# Altium footprint library 2.54-华普微电子模块.PcbLib: 59 footprints (part 2 of 4)
Each footprint in its own frame and in the unit in brackets; x right, y up, seen from the top. Pads: shape width x height; smd on the part's side, far side on the other; paste and mask are expansions set on the pad; w line width, h text height; cw(c..) or ccw(c..) is an arc to the next point about the centre after c.
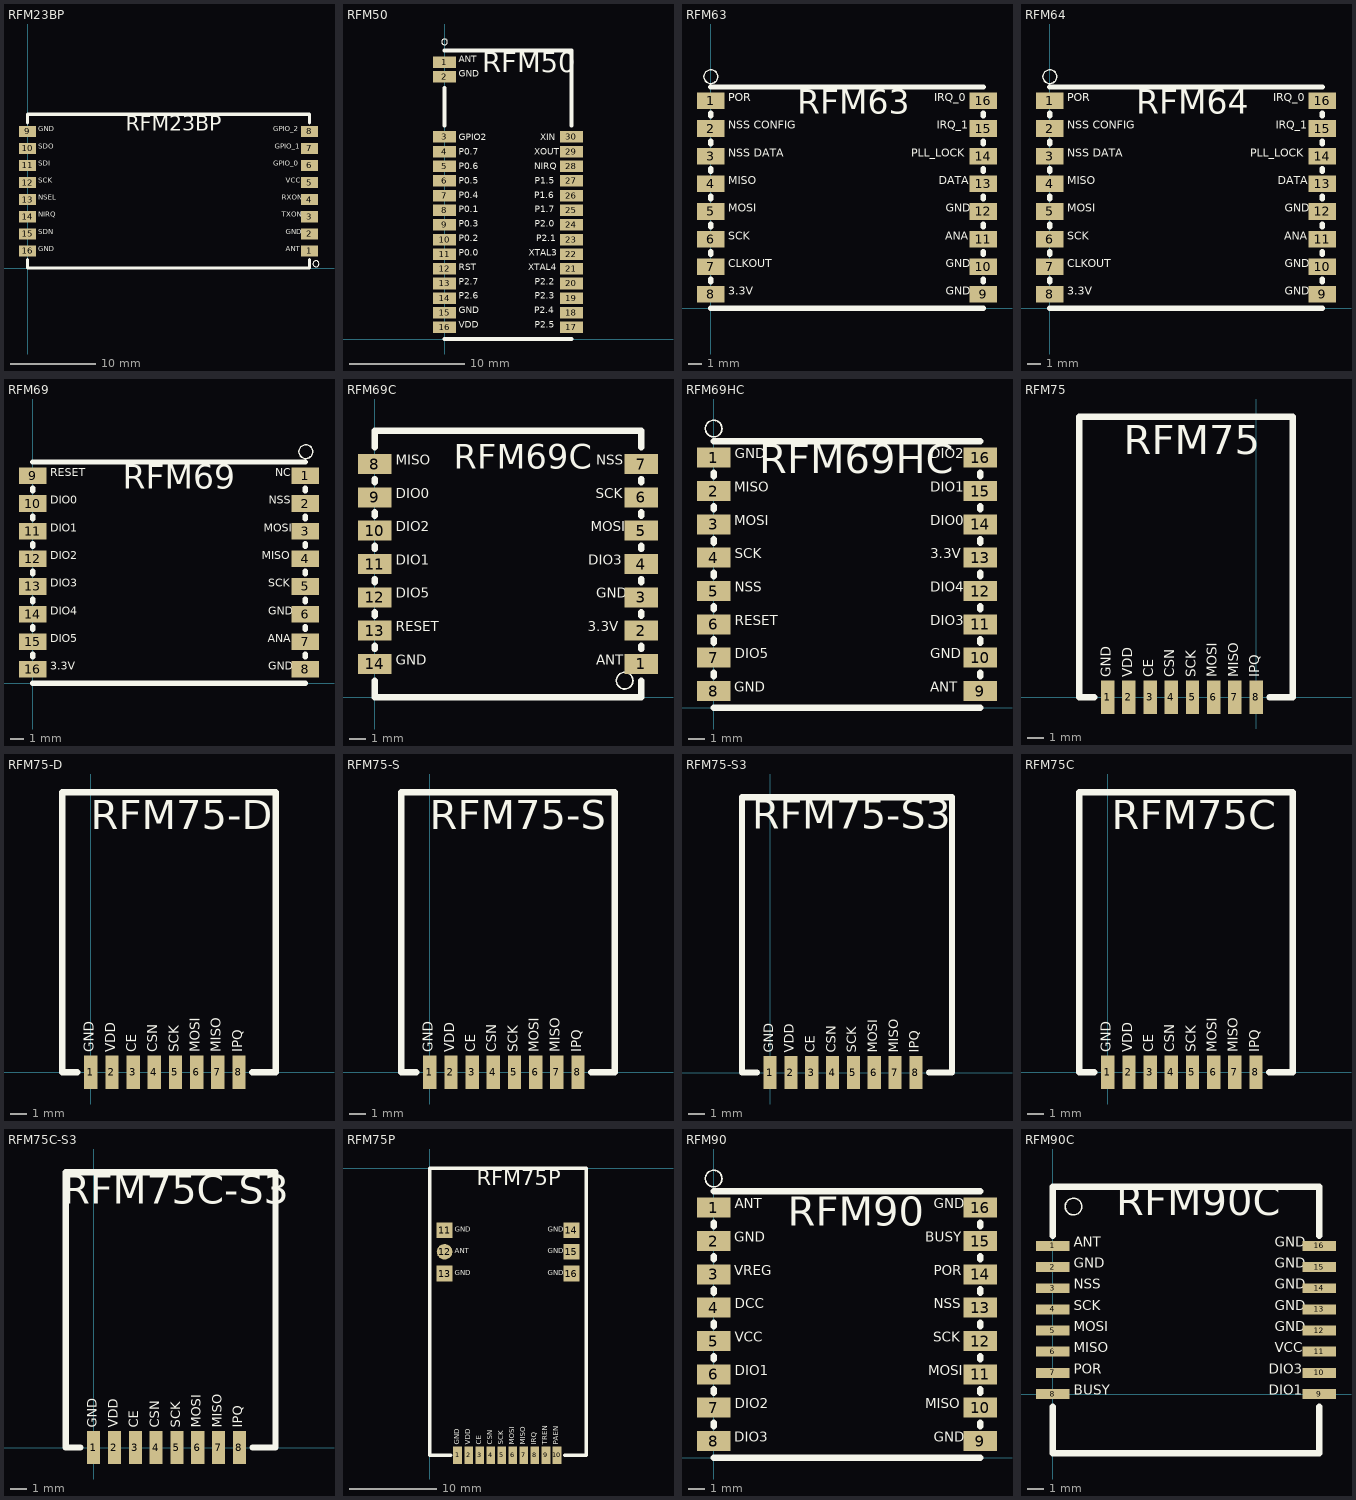
[diagram p1: the footprints below, top view; thin cyan lines are the x and y axes]

## RFM23BP [mm]
pads (16):
  rect 2x1.3 smd: 1(33,2) 2(33,4) 3(33,6) 4(33,8) 5(33,10) 6(33,12) 7(33,14) 8(33,16) 9(0,16) 10(0,14) 11(0,12) 12(0,10) 13(0,8) 14(0,6) 15(0,4) 16(0,2)
Top Overlay:
  circle w0.1: c33.75,0.5 r0.354
  lines w0.381: 0,1 0,0 33,0 33,1 ; 0,17 0,18 33,18 33,17
  text "GND" at 1.25,15.75 h1
  text "SDO" at 1.25,13.75 h1
  text "SDI" at 1.25,11.75 h1
  text "SCK" at 1.25,9.75 h1
  text "NSEL" at 1.25,7.75 h1
  text "NIRQ" at 1.25,5.75 h1
  text "SDN" at 1.25,3.75 h1
  text "GPIO_2" at 28.757,15.75 h1
  text "GPIO_1" at 28.902,13.75 h1
  text "GPIO_0" at 28.75,11.75 h1
  text "VCC" at 30.203,9.75 h1
  text "RXON" at 29.76,7.75 h1
  text "TXON" at 29.76,5.75 h1
  text "GND" at 30.239,3.75 h1
  text "GND" at 1.25,1.75 h1
  text "ANT" at 30.228,1.75 h1
  text "RFM23BP" at 11.5,15.5 h3

## RFM50 [mm]
pads (30):
  rect 2x1 smd: 1(0,24) 3(0,17.51) 4(0,16.24) 5(0,14.97) 6(0,13.7) 7(0,12.43) 8(0,11.16) 9(0,9.89) 10(0,8.62) 11(0,7.35) 12(0,6.08) 13(0,4.81) 14(0,3.54) 15(0,2.27) 16(0,1) 17(11,1) 18(11,2.27) 19(11,3.54) 20(11,4.81) 21(11,6.08) 22(11,7.35) 23(11,8.62) 24(11,9.89) 25(11,11.16) 26(11,12.43) 27(11,13.7) 28(11,14.97) 29(11,16.24) 30(11,17.51)
  rect 2x1 smd paste+0: 2(0,22.73)
Top Overlay:
  circle w0.1: c0,25.75 r0.25
  lines w0.381: 0,0 11,0 ; 0,18.5 0,21.75 ; 0,25 11,25 11,18.5
  text "RFM50" at 3.25,22.5 h3
  text "ANT" at 1.25,23.75 h1
  text "GND" at 1.25,22.5 h1
  text "GPIO2" at 1.25,17 h1
  text "P0.7" at 1.25,15.75 h1
  text "P0.6" at 1.25,14.5 h1
  text "P0.5" at 1.25,13.25 h1
  text "P0.4" at 1.25,12 h1
  text "P0.1" at 1.25,10.75 h1
  text "P0.3" at 1.25,9.5 h1
  text "P0.2" at 1.25,8.25 h1
  text "P0.0" at 1.25,7 h1
  text "RST" at 1.25,5.75 h1
  text "P2.7" at 1.25,4.5 h1
  text "P2.6" at 1.25,3.25 h1
  text "GND" at 1.25,2 h1
  text "VDD" at 1.25,0.75 h1
  text "P2.5" at 7.821,0.75 h1
  text "P2.4" at 7.784,2 h1
  text "P2.3" at 7.823,3.25 h1
  text "P2.2" at 7.823,4.5 h1
  text "XTAL4" at 7.25,5.75 h1
  text "XTAL3" at 7.289,7 h1
  text "P2.1" at 7.967,8.25 h1
  text "P2.0" at 7.816,9.5 h1
  text "P1.7" at 7.804,10.75 h1
  text "P1.6" at 7.79,12 h1
  text "NIRQ" at 7.792,14.505 h1
  text "XOUT" at 7.784,15.755 h1
  text "XIN" at 8.284,16.992 h1
  text "P1.5" at 7.821,13.25 h1

## RFM63 [mm]
pads (16):
  rect 2x1.2 smd: 1(0,15) 2(0,13) 3(0,11) 4(0,9) 5(0,7) 6(0,5) 7(0,3) 8(0,1) 9(19.7,1) 10(19.7,3) 11(19.7,5) 12(19.7,7) 13(19.7,9) 14(19.7,11) 15(19.7,13) 16(19.7,15)
Top Overlay:
  circle w0.1: c0,16.75 r0.5
  lines w0.381: 0,0 19.7,0 ; 0,1.9 0,2.1 ; 0,3.9 0,4.1 ; 0,5.9 0,6.1 ; 0,7.9 0,8.1 ; 0,9.9 0,10.1 ; 0,11.9 0,12.1 ; 0,13.9 0,14.1 ; 0,16 19.7,16 ; 19.7,1.9 19.7,2.1 ; 19.7,3.9 19.7,4.1 ; 19.7,5.9 19.7,6.1 ; 19.7,7.9 19.7,8.1 ; 19.7,9.9 19.7,10.1 ; 19.7,11.9 19.7,12.1 ; 19.7,13.9 19.7,14.1
  text "GND" at 17,0.75 h1
  text "GND" at 17,2.75 h1
  text "ANA" at 16.954,4.75 h1
  text "GND" at 17,6.75 h1
  text "IRQ_0" at 16.173,14.75 h1
  text "IRQ_1" at 16.325,12.75 h1
  text "PLL_LOCK" at 14.5,10.75 h1
  text "DATA" at 16.485,8.75 h1
  text "MOSI" at 1.25,6.75 h1
  text "SCK" at 1.25,4.75 h1
  text "CLKOUT" at 1.25,2.75 h1
  text "3.3V" at 1.249,0.75 h1
  text "MISO" at 1.25,8.75 h1
  text "NSS DATA" at 1.249,10.75 h1
  text "NSS CONFIG" at 1.249,12.75 h1
  text "POR" at 1.25,14.75 h1
  text "RFM63" at 6.25,13.5 h3

## RFM64 [mm]
pads (16):
  rect 2x1.2 smd: 1(0,15) 2(0,13) 3(0,11) 4(0,9) 5(0,7) 6(0,5) 7(0,3) 8(0,1) 9(19.7,1) 10(19.7,3) 11(19.7,5) 12(19.7,7) 13(19.7,9) 14(19.7,11) 15(19.7,13) 16(19.7,15)
Top Overlay:
  circle w0.1: c0,16.75 r0.5
  lines w0.381: 0,0 19.7,0 ; 0,1.9 0,2.1 ; 0,3.9 0,4.1 ; 0,5.9 0,6.1 ; 0,7.9 0,8.1 ; 0,9.9 0,10.1 ; 0,11.9 0,12.1 ; 0,13.9 0,14.1 ; 0,16 19.7,16 ; 19.7,1.9 19.7,2.1 ; 19.7,3.9 19.7,4.1 ; 19.7,5.9 19.7,6.1 ; 19.7,7.9 19.7,8.1 ; 19.7,9.9 19.7,10.1 ; 19.7,11.9 19.7,12.1 ; 19.7,13.9 19.7,14.1
  text "GND" at 17,0.75 h1
  text "GND" at 17,2.75 h1
  text "ANA" at 16.954,4.75 h1
  text "GND" at 17,6.75 h1
  text "IRQ_0" at 16.173,14.75 h1
  text "IRQ_1" at 16.325,12.75 h1
  text "PLL_LOCK" at 14.5,10.75 h1
  text "DATA" at 16.485,8.75 h1
  text "MOSI" at 1.25,6.75 h1
  text "SCK" at 1.25,4.75 h1
  text "CLKOUT" at 1.25,2.75 h1
  text "3.3V" at 1.249,0.75 h1
  text "MISO" at 1.25,8.75 h1
  text "NSS DATA" at 1.249,10.75 h1
  text "NSS CONFIG" at 1.249,12.75 h1
  text "POR" at 1.25,14.75 h1
  text "RFM64" at 6.25,13.5 h3

## RFM69 [mm]
pads (16):
  rect 2x1.2 smd: 1(19.7,15) 2(19.7,13) 3(19.7,11) 4(19.7,9) 5(19.7,7) 6(19.7,5) 7(19.7,3) 8(19.7,1) 9(0,15) 10(0,13) 11(0,11) 12(0,9) 13(0,7) 14(0,5) 15(0,3) 16(0,1)
Top Overlay:
  circle w0.1: c19.75,16.75 r0.5
  lines w0.381: 0,0 19.7,0 ; 0,1.9 0,2.1 ; 0,3.9 0,4.1 ; 0,5.9 0,6.1 ; 0,7.9 0,8.1 ; 0,9.9 0,10.1 ; 0,11.9 0,12.1 ; 0,13.9 0,14.1 ; 0,16 19.7,16 ; 19.7,1.9 19.7,2.1 ; 19.7,3.9 19.7,4.1 ; 19.7,5.9 19.7,6.1 ; 19.7,7.9 19.7,8.1 ; 19.7,9.9 19.7,10.1 ; 19.7,11.9 19.7,12.1 ; 19.7,13.9 19.7,14.1
  text "GND" at 17.046,0.75 h1
  text "ANA" at 17,2.75 h1
  text "GND" at 17.046,4.75 h1
  text "SCK" at 17.027,6.75 h1
  text "NC" at 17.541,14.75 h1
  text "NSS" at 17.054,12.75 h1
  text "MOSI" at 16.714,10.75 h1
  text "MISO" at 16.543,8.75 h1
  text "DIO3" at 1.25,6.75 h1
  text "DIO4" at 1.25,4.75 h1
  text "DIO5" at 1.25,2.75 h1
  text "3.3V" at 1.249,0.75 h1
  text "DIO2" at 1.25,8.75 h1
  text "DIO1" at 1.249,10.75 h1
  text "DIO0" at 1.249,12.75 h1
  text "RESET" at 1.25,14.75 h1
  text "RFM69" at 6.5,13.5 h3

## RFM69C [mm]
pads (14):
  rect 2x1.2 smd: 1(16,2) 2(16,4) 3(16,6) 4(16,8) 5(16,10) 6(16,12) 7(16,14) 8(0,14) 9(0,12) 10(0,10) 11(0,8) 12(0,6) 13(0,4) 14(0,2)
Top Overlay:
  circle w0.1: c15,1 r0.5
  lines w0.381: 0,1 0,0 16,0 16,1 ; 0,2.9 0,3.1 ; 0,4.9 0,5.1 ; 0,6.9 0,7.1 ; 0,8.9 0,9.1 ; 0,10.9 0,11.1 ; 0,12.9 0,13.1 ; 0,15 0,16 16,16 16,15 ; 16,2.9 16,3.1 ; 16,4.9 16,5.1 ; 16,6.9 16,7.1 ; 16,8.9 16,9.1 ; 16,10.9 16,11.1 ; 16,12.9 16,13.1
  text "ANT" at 13.285,1.75 h1
  text "3.3V" at 12.781,3.75 h1
  text "GND" at 13.296,5.75 h1
  text "DIO3" at 12.82,7.75 h1
  text "MOSI" at 12.964,9.75 h1
  text "SCK" at 13.276,11.75 h1
  text "NSS" at 13.303,13.75 h1
  text "GND" at 1.25,1.75 h1
  text "RESET" at 1.25,3.75 h1
  text "DIO5" at 1.25,5.75 h1
  text "DIO1" at 1.25,7.75 h1
  text "DIO2" at 1.25,9.75 h1
  text "DIO0" at 1.25,11.75 h1
  text "MISO" at 1.25,13.75 h1
  text "RFM69C" at 4.75,13.25 h2.5

## RFM69HC [mm]
pads (16):
  rect 2x1.2 smd: 1(0,15) 2(0,13) 3(0,11) 4(0,9) 5(0,7) 6(0,5) 7(0,3) 8(0,1) 9(16,1) 10(16,3) 11(16,5) 12(16,7) 13(16,9) 14(16,11) 15(16,13) 16(16,15)
Top Overlay:
  circle w0.1: c0,16.75 r0.5
  lines w0.381: 0,0 16,0 ; 0,1.9 0,2.1 ; 0,3.9 0,4.1 ; 0,5.9 0,6.1 ; 0,7.9 0,8.1 ; 0,9.9 0,10.1 ; 0,11.9 0,12.1 ; 0,13.9 0,14.1 ; 0,16 16,16 ; 16,1.9 16,2.1 ; 16,3.9 16,4.1 ; 16,5.9 16,6.1 ; 16,7.9 16,8.1 ; 16,9.9 16,10.1 ; 16,11.9 16,12.1 ; 16,13.9 16,14.1
  text "ANT" at 13.001,0.75 h1
  text "GND" at 13.001,2.75 h1
  text "DIO3" at 13,4.75 h1
  text "DIO4" at 13,6.75 h1
  text "DIO2" at 13,14.75 h1
  text "DIO1" at 13,12.75 h1
  text "DIO0" at 13,10.75 h1
  text "3.3V" at 13,8.75 h1
  text "NSS" at 1.25,6.75 h1
  text "RESET" at 1.25,4.75 h1
  text "DIO5" at 1.25,2.75 h1
  text "GND" at 1.249,0.75 h1
  text "SCK" at 1.25,8.75 h1
  text "MOSI" at 1.249,10.75 h1
  text "MISO" at 1.249,12.75 h1
  text "GND" at 1.25,14.75 h1
  text "RFM69HC" at 2.75,13.5 h3

## RFM75 [mm]
pads (8):
  rect 0.8x2 smd: 1(-8.89,0) 2(-7.62,0) 3(-6.35,0) 4(-5.08,0) 5(-3.81,0) 6(-2.54,0) 7(-1.27,0) 8(0,0)
Top Overlay:
  lines w0.381: -9.7,0 -10.6,0 -10.6,16.8 2.2,16.8 2.2,0 0.8,0
  text "RFM75" at -7.915,13.97 h3
  text "IPQ" at 0.4,1.2 h1
  text "MISO" at -0.87,1.2 h1
  text "MOSI" at -2.14,1.2 h1
  text "SCK" at -3.41,1.2 h1
  text "CSN" at -4.68,1.2 h1
  text "CE" at -5.95,1.2 h1
  text "VDD" at -7.22,1.2 h1
  text "GND" at -8.49,1.2 h1

## RFM75-D [mm]
pads (8):
  rect 0.8x2 smd: 1(0,0) 2(1.27,0) 3(2.54,0) 4(3.81,0) 5(5.08,0) 6(6.35,0) 7(7.62,0) 8(8.89,0)
Top Overlay:
  lines w0.381: -0.81,0 -1.71,0 -1.71,16.8 11.09,16.8 11.09,0 9.69,0
  text "GND" at 0.4,1.2 h1
  text "VDD" at 1.67,1.2 h1
  text "CE" at 2.94,1.2 h1
  text "CSN" at 4.21,1.2 h1
  text "SCK" at 5.48,1.2 h1
  text "MOSI" at 6.75,1.2 h1
  text "MISO" at 8.02,1.2 h1
  text "IPQ" at 9.29,1.2 h1
  text "RFM75-D" at 0,14 h3

## RFM75-S [mm]
pads (8):
  rect 0.8x2 smd: 1(0,0) 2(1.27,0) 3(2.54,0) 4(3.81,0) 5(5.08,0) 6(6.35,0) 7(7.62,0) 8(8.89,0)
Top Overlay:
  lines w0.381: -0.81,0 -1.71,0 -1.71,16.8 11.09,16.8 11.09,0 9.69,0
  text "RFM75-S" at 0,14 h3
  text "IPQ" at 9.29,1.2 h1
  text "MISO" at 8.02,1.2 h1
  text "MOSI" at 6.75,1.2 h1
  text "SCK" at 5.48,1.2 h1
  text "CSN" at 4.21,1.2 h1
  text "CE" at 2.94,1.2 h1
  text "VDD" at 1.67,1.2 h1
  text "GND" at 0.4,1.2 h1

## RFM75-S3 [mm]
pads (8):
  rect 0.8x2 smd: 1(0,0) 2(1.27,0) 3(2.54,0) 4(3.81,0) 5(5.08,0) 6(6.35,0) 7(7.62,0) 8(8.89,0)
Top Overlay:
  lines w0.381: -0.81,0 -1.71,0 -1.71,16.8 11.09,16.8 11.09,0 9.69,0
  text "RFM75-S3" at -1.1,14.3 h3
  text "IPQ" at 9.29,1.2 h1
  text "MISO" at 8.02,1.2 h1
  text "MOSI" at 6.75,1.2 h1
  text "SCK" at 5.48,1.2 h1
  text "CSN" at 4.21,1.2 h1
  text "CE" at 2.94,1.2 h1
  text "VDD" at 1.67,1.2 h1
  text "GND" at 0.4,1.2 h1

## RFM75C [mm]
pads (8):
  rect 0.8x2 smd: 1(0,0) 2(1.27,0) 3(2.54,0) 4(3.81,0) 5(5.08,0) 6(6.35,0) 7(7.62,0) 8(8.89,0)
Top Overlay:
  lines w0.381: -0.81,0 -1.71,0 -1.71,16.8 11.09,16.8 11.09,0 9.69,0
  text "GND" at 0.4,1.2 h1
  text "VDD" at 1.67,1.2 h1
  text "CE" at 2.94,1.2 h1
  text "CSN" at 4.21,1.2 h1
  text "SCK" at 5.48,1.2 h1
  text "MOSI" at 6.75,1.2 h1
  text "MISO" at 8.02,1.2 h1
  text "IPQ" at 9.29,1.2 h1
  text "RFM75C" at 0.25,14 h3

## RFM75C-S3 [mm]
pads (8):
  rect 0.8x2 smd: 1(0,0) 2(1.27,0) 3(2.54,0) 4(3.81,0) 5(5.08,0) 6(6.35,0) 7(7.62,0) 8(8.89,0)
Top Overlay:
  lines w0.381: -0.81,0 -1.71,0 -1.71,16.8 11.09,16.8 11.09,0 9.69,0
  text "GND" at 0.4,1.2 h1
  text "VDD" at 1.67,1.2 h1
  text "CE" at 2.94,1.2 h1
  text "CSN" at 4.21,1.2 h1
  text "SCK" at 5.48,1.2 h1
  text "MOSI" at 6.75,1.2 h1
  text "MISO" at 8.02,1.2 h1
  text "IPQ" at 9.29,1.2 h1
  text "RFM75C-S3" at -1.9,14.3 h3

## RFM75P [mm]
pads (16):
  rect 1x2 smd: 1(3.2,-33) 2(4.47,-33) 3(5.74,-33) 4(7.01,-33) 5(8.28,-33) 6(9.55,-33) 7(10.82,-33) 8(12.09,-33) 9(13.36,-33) 10(14.63,-33)
  rect 1.8x1.8 smd: 11(1.7,-7.1) 13(1.7,-12.1) 14(16.3,-7.1) 15(16.3,-9.6) 16(16.3,-12.1)
  round 1.8 smd: 12(1.7,-9.6)
Top Overlay:
  lines w0.381: 2.4,-33 0,-33 0,0 18,0 18,-33 15.5,-33
  text "GND" at 3.6,-31.8 h1
  text "VDD" at 4.87,-31.8 h1
  text "CE" at 6.14,-31.8 h1
  text "CSN" at 7.41,-31.8 h1
  text "SCK" at 8.68,-31.8 h1
  text "MOSI" at 9.95,-31.8 h1
  text "MISO" at 11.22,-31.8 h1
  text "IRQ" at 12.49,-31.8 h1
  text "TREN" at 13.76,-31.8 h1
  text "PAEN" at 15.03,-31.8 h1
  text "GND" at 2.9,-7.5 h1
  text "ANT" at 2.9,-10 h1
  text "GND" at 2.9,-12.5 h1
  text "GND" at 13.6,-7.5 h1
  text "GND" at 13.6,-10 h1
  text "GND" at 13.6,-12.5 h1
  text "RFM75P" at 5.4,-2.5 h3

## RFM90 [mm]
pads (16):
  rect 2x1.2 smd: 1(0,15) 2(0,13) 3(0,11) 4(0,9) 5(0,7) 6(0,5) 7(0,3) 8(0,1) 9(16,1) 10(16,3) 11(16,5) 12(16,7) 13(16,9) 14(16,11) 15(16,13) 16(16,15)
Top Overlay:
  circle w0.1: c0,16.75 r0.5
  lines w0.381: 0,0 16,0 ; 0,1.9 0,2.1 ; 0,3.9 0,4.1 ; 0,5.9 0,6.1 ; 0,7.9 0,8.1 ; 0,9.9 0,10.1 ; 0,11.9 0,12.1 ; 0,13.9 0,14.1 ; 0,16 16,16 ; 16,1.9 16,2.1 ; 16,3.9 16,4.1 ; 16,5.9 16,6.1 ; 16,7.9 16,8.1 ; 16,9.9 16,10.1 ; 16,11.9 16,12.1 ; 16,13.9 16,14.1
  text "GND" at 13.207,0.75 h1
  text "MISO" at 12.704,2.75 h1
  text "MOSI" at 12.875,4.75 h1
  text "SCK" at 13.187,6.75 h1
  text "GND" at 13.207,14.75 h1
  text "BUSY" at 12.699,12.75 h1
  text "POR" at 13.21,10.75 h1
  text "NSS" at 13.214,8.75 h1
  text "VCC" at 1.25,6.75 h1
  text "DIO1" at 1.25,4.75 h1
  text "DIO2" at 1.25,2.75 h1
  text "DIO3" at 1.249,0.75 h1
  text "DCC" at 1.25,8.75 h1
  text "VREG" at 1.249,10.75 h1
  text "GND" at 1.249,12.75 h1
  text "ANT" at 1.25,14.75 h1
  text "RFM90" at 4.445,13.335 h3

## RFM90C [mm]
pads (16):
  rect 2x0.6 smd: 1(0,8.89) 2(0,7.62) 3(0,6.35) 4(0,5.08) 5(0,3.81) 6(0,2.54) 7(0,1.27) 8(0,0) 9(16,0) 10(16,1.27) 11(16,2.54) 12(16,3.81) 13(16,5.08) 14(16,6.35) 15(16,7.62) 16(16,8.89)
Top Overlay:
  circle w0.1: c1.25,11.25 r0.5
  lines w0.381: 0,-0.75 0,-3.55 16,-3.55 16,-0.75 ; 0,9.5 0,12.45 16,12.45 16,9.5
  text "GND" at 13.335,8.636 h1
  text "GND" at 13.335,7.366 h1
  text "GND" at 13.335,6.096 h1
  text "GND" at 13.335,4.826 h1
  text "GND" at 13.335,3.556 h1
  text "VCC" at 13.335,2.286 h1
  text "DIO3" at 12.954,1.016 h1
  text "DIO1" at 12.954,-0.254 h1
  text "BUSY" at 1.27,-0.254 h1
  text "POR" at 1.27,1.016 h1
  text "MISO" at 1.27,2.286 h1
  text "MOSI" at 1.27,3.556 h1
  text "SCK" at 1.27,4.826 h1
  text "NSS" at 1.27,6.096 h1
  text "GND" at 1.27,7.366 h1
  text "ANT" at 1.27,8.636 h1
  text "RFM90C" at 3.81,10.16 h3